# Altium integrated library WCAP-ATLL_rev15a.intlib: 209 symbols (part 1 of 3) (continued)
## WCAP-ATLL 10x12.5x5x0.6 860160375025
designator C?, comment 470 μF
WCAP-ATLL Aluminum Electrolytic Capacitors , 470 μF; + / - 20%; 16 V , 10 x 12,5; Manufacturer: Wurth Elektronik; partNo: 860160375025; E-mail: libraries@we-online.com; Characteristics: Aluminum Electrolytic Capacitor;Recommended soldering: Wave;Operating temperature: –55 °C to +105 °C;Low impedance and high temperature product series;Load life: 3000–10000 h @ +105 °C; ComponentLink1Description: Manufacturer; ComponentLink1URL: http://www.we-online.com; ComponentLink2Description: Datasheet; ComponentLink2URL: http://katalog.we-online.de/pbs/datasheet/860160375025.pdf; Created by: Karrer Zheng; Created Date: 5/13/2015; Capacitance: 470 μF; Application: Used in circuit with rigorous conditions and high ambient temperature;  applied to the secondary side output filtering loop, used in switching power supply with higher operating temperature, DC-DC converter, AC-DC converter, adapter, charger, TV, VCR, DC motor circuit filter, high-end switching power supply, LCD TV, energy saving lamps, electronic ballast, LED lamp and etc.
footprint WCAP-ATLL 10x12.5x5x0.6
pins: 1, 2

## WCAP-ATLL 10x12.5x5x0.6 860160375027
designator C?, comment 560 μF
WCAP-ATLL Aluminum Electrolytic Capacitors , 560 μF; + / - 20%; 16 V , 10 x 12,5; Manufacturer: Wurth Elektronik; partNo: 860160375027; E-mail: libraries@we-online.com; Characteristics: Aluminum Electrolytic Capacitor;Recommended soldering: Wave;Operating temperature: –55 °C to +105 °C;Low impedance and high temperature product series;Load life: 3000–10000 h @ +105 °C; ComponentLink1Description: Manufacturer; ComponentLink1URL: http://www.we-online.com; ComponentLink2Description: Datasheet; ComponentLink2URL: http://katalog.we-online.de/pbs/datasheet/860160375027.pdf; Created by: Karrer Zheng; Created Date: 5/13/2015; Capacitance: 560 μF; Application: Used in circuit with rigorous conditions and high ambient temperature;  applied to the secondary side output filtering loop, used in switching power supply with higher operating temperature, DC-DC converter, AC-DC converter, adapter, charger, TV, VCR, DC motor circuit filter, high-end switching power supply, LCD TV, energy saving lamps, electronic ballast, LED lamp and etc.
footprint WCAP-ATLL 10x12.5x5x0.6
pins: 1, 2

## WCAP-ATLL 10x16x5x0.6 860160375029
designator C?, comment 680 μF
WCAP-ATLL Aluminum Electrolytic Capacitors , 680 μF; + / - 20%; 16 V , 10 x 16; Manufacturer: Wurth Elektronik; partNo: 860160375029; E-mail: libraries@we-online.com; Characteristics: Aluminum Electrolytic Capacitor;Recommended soldering: Wave;Operating temperature: –55 °C to +105 °C;Low impedance and high temperature product series;Load life: 3000–10000 h @ +105 °C; ComponentLink1Description: Manufacturer; ComponentLink1URL: http://www.we-online.com; ComponentLink2Description: Datasheet; ComponentLink2URL: http://katalog.we-online.de/pbs/datasheet/860160375029.pdf; Created by: Karrer Zheng; Created Date: 5/13/2015; Capacitance: 680 μF; Application: Used in circuit with rigorous conditions and high ambient temperature;  applied to the secondary side output filtering loop, used in switching power supply with higher operating temperature, DC-DC converter, AC-DC converter, adapter, charger, TV, VCR, DC motor circuit filter, high-end switching power supply, LCD TV, energy saving lamps, electronic ballast, LED lamp and etc.
footprint WCAP-ATLL 10x16x5x0.6
pins: 1, 2

## WCAP-ATLL 10x16x5x0.6 860160375031
designator C?, comment 820 μF
WCAP-ATLL Aluminum Electrolytic Capacitors , 820 μF; + / - 20%; 16 V , 10 x 16; Manufacturer: Wurth Elektronik; partNo: 860160375031; E-mail: libraries@we-online.com; Characteristics: Aluminum Electrolytic Capacitor;Recommended soldering: Wave;Operating temperature: –55 °C to +105 °C;Low impedance and high temperature product series;Load life: 3000–10000 h @ +105 °C; ComponentLink1Description: Manufacturer; ComponentLink1URL: http://www.we-online.com; ComponentLink2Description: Datasheet; ComponentLink2URL: http://katalog.we-online.de/pbs/datasheet/860160375031.pdf; Created by: Karrer Zheng; Created Date: 5/13/2015; Capacitance: 820 μF; Application: Used in circuit with rigorous conditions and high ambient temperature;  applied to the secondary side output filtering loop, used in switching power supply with higher operating temperature, DC-DC converter, AC-DC converter, adapter, charger, TV, VCR, DC motor circuit filter, high-end switching power supply, LCD TV, energy saving lamps, electronic ballast, LED lamp and etc.
footprint WCAP-ATLL 10x16x5x0.6
pins: 1, 2

## WCAP-ATLL 10x16x5x0.6 860160375032
designator C?, comment 1000 μF
WCAP-ATLL Aluminum Electrolytic Capacitors , 1000 μF; + / - 20%; 16 V , 10 x 16; Manufacturer: Wurth Elektronik; partNo: 860160375032; E-mail: libraries@we-online.com; Characteristics: Aluminum Electrolytic Capacitor;Recommended soldering: Wave;Operating temperature: –55 °C to +105 °C;Low impedance and high temperature product series;Load life: 3000–10000 h @ +105 °C; ComponentLink1Description: Manufacturer; ComponentLink1URL: http://www.we-online.com; ComponentLink2Description: Datasheet; ComponentLink2URL: http://katalog.we-online.de/pbs/datasheet/860160375032.pdf; Created by: Karrer Zheng; Created Date: 5/13/2015; Capacitance: 1000 μF; Application: Used in circuit with rigorous conditions and high ambient temperature;  applied to the secondary side output filtering loop, used in switching power supply with higher operating temperature, DC-DC converter, AC-DC converter, adapter, charger, TV, VCR, DC motor circuit filter, high-end switching power supply, LCD TV, energy saving lamps, electronic ballast, LED lamp and etc.
footprint WCAP-ATLL 10x16x5x0.6
pins: 1, 2

## WCAP-ATLL 10x20x5x0.6 860160375033
designator C?, comment 1200 μF
WCAP-ATLL Aluminum Electrolytic Capacitors , 1200 μF; + / - 20%; 16 V , 10 x 20; Manufacturer: Wurth Elektronik; partNo: 860160375033; E-mail: libraries@we-online.com; Characteristics: Aluminum Electrolytic Capacitor;Recommended soldering: Wave;Operating temperature: –55 °C to +105 °C;Low impedance and high temperature product series;Load life: 3000–10000 h @ +105 °C; ComponentLink1Description: Manufacturer; ComponentLink1URL: http://www.we-online.com; ComponentLink2Description: Datasheet; ComponentLink2URL: http://katalog.we-online.de/pbs/datasheet/860160375033.pdf; Created by: Karrer Zheng; Created Date: 5/13/2015; Capacitance: 1200 μF; Application: Used in circuit with rigorous conditions and high ambient temperature;  applied to the secondary side output filtering loop, used in switching power supply with higher operating temperature, DC-DC converter, AC-DC converter, adapter, charger, TV, VCR, DC motor circuit filter, high-end switching power supply, LCD TV, energy saving lamps, electronic ballast, LED lamp and etc.
footprint WCAP-ATLL 10x20x5x0.6
pins: 1, 2

## WCAP-ATLL 10x25x5x0.6 860160375034
designator C?, comment 1500 μF
WCAP-ATLL Aluminum Electrolytic Capacitors , 1500 μF; + / - 20%; 16 V , 10 x 25; Manufacturer: Wurth Elektronik; partNo: 860160375034; E-mail: libraries@we-online.com; Characteristics: Aluminum Electrolytic Capacitor;Recommended soldering: Wave;Operating temperature: –55 °C to +105 °C;Low impedance and high temperature product series;Load life: 3000–10000 h @ +105 °C; ComponentLink1Description: Manufacturer; ComponentLink1URL: http://www.we-online.com; ComponentLink2Description: Datasheet; ComponentLink2URL: http://katalog.we-online.de/pbs/datasheet/860160375034.pdf; Created by: Karrer Zheng; Created Date: 5/13/2015; Capacitance: 1500 μF; Application: Used in circuit with rigorous conditions and high ambient temperature;  applied to the secondary side output filtering loop, used in switching power supply with higher operating temperature, DC-DC converter, AC-DC converter, adapter, charger, TV, VCR, DC motor circuit filter, high-end switching power supply, LCD TV, energy saving lamps, electronic ballast, LED lamp and etc.
footprint WCAP-ATLL 10x25x5x0.6
pins: 1, 2

## WCAP-ATLL 10x30x5x0.6 860160375036
designator C?, comment 1800 μF
WCAP-ATLL Aluminum Electrolytic Capacitors , 1800 μF; + / - 20%; 16 V , 10 x 30; Manufacturer: Wurth Elektronik; partNo: 860160375036; E-mail: libraries@we-online.com; Characteristics: Aluminum Electrolytic Capacitor;Recommended soldering: Wave;Operating temperature: –55 °C to +105 °C;Low impedance and high temperature product series;Load life: 3000–10000 h @ +105 °C; ComponentLink1Description: Manufacturer; ComponentLink1URL: http://www.we-online.com; ComponentLink2Description: Datasheet; ComponentLink2URL: http://katalog.we-online.de/pbs/datasheet/860160375036.pdf; Created by: Karrer Zheng; Created Date: 5/13/2015; Capacitance: 1800 μF; Application: Used in circuit with rigorous conditions and high ambient temperature;  applied to the secondary side output filtering loop, used in switching power supply with higher operating temperature, DC-DC converter, AC-DC converter, adapter, charger, TV, VCR, DC motor circuit filter, high-end switching power supply, LCD TV, energy saving lamps, electronic ballast, LED lamp and etc.
footprint WCAP-ATLL 10x30x5x0.6
pins: 1, 2

## WCAP-ATLL 13x20x5x0.6 860160378035
designator C?, comment 1500 μF
WCAP-ATLL Aluminum Electrolytic Capacitors , 1500 μF; + / - 20%; 16 V , 13 x 20; Manufacturer: Wurth Elektronik; partNo: 860160378035; E-mail: libraries@we-online.com; Characteristics: Aluminum Electrolytic Capacitor;Recommended soldering: Wave;Operating temperature: –55 °C to +105 °C;Low impedance and high temperature product series;Load life: 3000–10000 h @ +105 °C; ComponentLink1Description: Manufacturer; ComponentLink1URL: http://www.we-online.com; ComponentLink2Description: Datasheet; ComponentLink2URL: http://katalog.we-online.de/pbs/datasheet/860160378035.pdf; Created by: Karrer Zheng; Created Date: 5/13/2015; Capacitance: 1500 μF; Application: Used in circuit with rigorous conditions and high ambient temperature;  applied to the secondary side output filtering loop, used in switching power supply with higher operating temperature, DC-DC converter, AC-DC converter, adapter, charger, TV, VCR, DC motor circuit filter, high-end switching power supply, LCD TV, energy saving lamps, electronic ballast, LED lamp and etc.
footprint WCAP-ATLL 13x20x5x0.6
pins: 1, 2

## WCAP-ATLL 13x20x5x0.6 860160378037
designator C?, comment 1800 μF
WCAP-ATLL Aluminum Electrolytic Capacitors , 1800 μF; + / - 20%; 16 V , 13 x 20; Manufacturer: Wurth Elektronik; partNo: 860160378037; E-mail: libraries@we-online.com; Characteristics: Aluminum Electrolytic Capacitor;Recommended soldering: Wave;Operating temperature: –55 °C to +105 °C;Low impedance and high temperature product series;Load life: 3000–10000 h @ +105 °C; ComponentLink1Description: Manufacturer; ComponentLink1URL: http://www.we-online.com; ComponentLink2Description: Datasheet; ComponentLink2URL: http://katalog.we-online.de/pbs/datasheet/860160378037.pdf; Created by: Karrer Zheng; Created Date: 5/13/2015; Capacitance: 1800 μF; Application: Used in circuit with rigorous conditions and high ambient temperature;  applied to the secondary side output filtering loop, used in switching power supply with higher operating temperature, DC-DC converter, AC-DC converter, adapter, charger, TV, VCR, DC motor circuit filter, high-end switching power supply, LCD TV, energy saving lamps, electronic ballast, LED lamp and etc.
footprint WCAP-ATLL 13x20x5x0.6
pins: 1, 2

## WCAP-ATLL 13x20x5x0.6 860160378038
designator C?, comment 2200 μF
WCAP-ATLL Aluminum Electrolytic Capacitors , 2200 μF; + / - 20%; 16 V , 13 x 20; Manufacturer: Wurth Elektronik; partNo: 860160378038; E-mail: libraries@we-online.com; Characteristics: Aluminum Electrolytic Capacitor;Recommended soldering: Wave;Operating temperature: –55 °C to +105 °C;Low impedance and high temperature product series;Load life: 3000–10000 h @ +105 °C; ComponentLink1Description: Manufacturer; ComponentLink1URL: http://www.we-online.com; ComponentLink2Description: Datasheet; ComponentLink2URL: http://katalog.we-online.de/pbs/datasheet/860160378038.pdf; Created by: Karrer Zheng; Created Date: 5/13/2015; Capacitance: 2200 μF; Application: Used in circuit with rigorous conditions and high ambient temperature;  applied to the secondary side output filtering loop, used in switching power supply with higher operating temperature, DC-DC converter, AC-DC converter, adapter, charger, TV, VCR, DC motor circuit filter, high-end switching power supply, LCD TV, energy saving lamps, electronic ballast, LED lamp and etc.
footprint WCAP-ATLL 13x20x5x0.6
pins: 1, 2

## WCAP-ATLL 13x25x5x0.6 860160378039
designator C?, comment 2700 μF
WCAP-ATLL Aluminum Electrolytic Capacitors , 2700 μF; + / - 20%; 16 V , 13 x 25; Manufacturer: Wurth Elektronik; partNo: 860160378039; E-mail: libraries@we-online.com; Characteristics: Aluminum Electrolytic Capacitor;Recommended soldering: Wave;Operating temperature: –55 °C to +105 °C;Low impedance and high temperature product series;Load life: 3000–10000 h @ +105 °C; ComponentLink1Description: Manufacturer; ComponentLink1URL: http://www.we-online.com; ComponentLink2Description: Datasheet; ComponentLink2URL: http://katalog.we-online.de/pbs/datasheet/860160378039.pdf; Created by: Karrer Zheng; Created Date: 5/13/2015; Capacitance: 2700 μF; Application: Used in circuit with rigorous conditions and high ambient temperature;  applied to the secondary side output filtering loop, used in switching power supply with higher operating temperature, DC-DC converter, AC-DC converter, adapter, charger, TV, VCR, DC motor circuit filter, high-end switching power supply, LCD TV, energy saving lamps, electronic ballast, LED lamp and etc.
footprint WCAP-ATLL 13x25x5x0.6
pins: 1, 2

## WCAP-ATLL 13x30x5x0.6 860160378040
designator C?, comment 3300 μF
WCAP-ATLL Aluminum Electrolytic Capacitors , 3300 μF; + / - 20%; 16 V , 13 x 30; Manufacturer: Wurth Elektronik; partNo: 860160378040; E-mail: libraries@we-online.com; Characteristics: Aluminum Electrolytic Capacitor;Recommended soldering: Wave;Operating temperature: –55 °C to +105 °C;Low impedance and high temperature product series;Load life: 3000–10000 h @ +105 °C; ComponentLink1Description: Manufacturer; ComponentLink1URL: http://www.we-online.com; ComponentLink2Description: Datasheet; ComponentLink2URL: http://katalog.we-online.de/pbs/datasheet/860160378040.pdf; Created by: Karrer Zheng; Created Date: 5/13/2015; Capacitance: 3300 μF; Application: Used in circuit with rigorous conditions and high ambient temperature;  applied to the secondary side output filtering loop, used in switching power supply with higher operating temperature, DC-DC converter, AC-DC converter, adapter, charger, TV, VCR, DC motor circuit filter, high-end switching power supply, LCD TV, energy saving lamps, electronic ballast, LED lamp and etc.
footprint WCAP-ATLL 13x30x5x0.6
pins: 1, 2

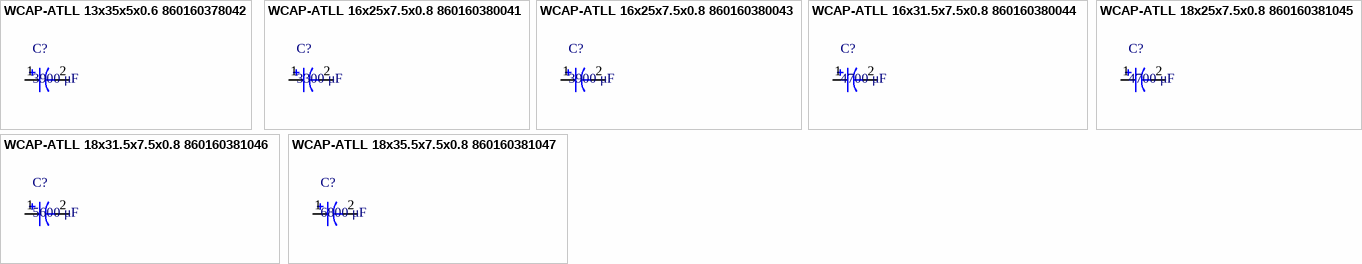
[diagram p3: symbols WCAP-ATLL 13x35x5x0.6 860160378042 to WCAP-ATLL 18x35.5x7.5x0.8 860160381047]

## WCAP-ATLL 13x35x5x0.6 860160378042
designator C?, comment 3900 μF
WCAP-ATLL Aluminum Electrolytic Capacitors , 3900 μF; + / - 20%; 16 V , 13 x 35; Manufacturer: Wurth Elektronik; partNo: 860160378042; E-mail: libraries@we-online.com; Characteristics: Aluminum Electrolytic Capacitor;Recommended soldering: Wave;Operating temperature: –55 °C to +105 °C;Low impedance and high temperature product series;Load life: 3000–10000 h @ +105 °C; ComponentLink1Description: Manufacturer; ComponentLink1URL: http://www.we-online.com; ComponentLink2Description: Datasheet; ComponentLink2URL: http://katalog.we-online.de/pbs/datasheet/860160378042.pdf; Created by: Karrer Zheng; Created Date: 5/13/2015; Capacitance: 3900 μF; Application: Used in circuit with rigorous conditions and high ambient temperature;  applied to the secondary side output filtering loop, used in switching power supply with higher operating temperature, DC-DC converter, AC-DC converter, adapter, charger, TV, VCR, DC motor circuit filter, high-end switching power supply, LCD TV, energy saving lamps, electronic ballast, LED lamp and etc.
footprint WCAP-ATLL 13x35x5x0.6
pins: 1, 2

## WCAP-ATLL 16x25x7.5x0.8 860160380041
designator C?, comment 3300 μF
WCAP-ATLL Aluminum Electrolytic Capacitors , 3300 μF; + / - 20%; 16 V , 16 x 25; Manufacturer: Wurth Elektronik; partNo: 860160380041; E-mail: libraries@we-online.com; Characteristics: Aluminum Electrolytic Capacitor;Recommended soldering: Wave;Operating temperature: –55 °C to +105 °C;Low impedance and high temperature product series;Load life: 3000–10000 h @ +105 °C; ComponentLink1Description: Manufacturer; ComponentLink1URL: http://www.we-online.com; ComponentLink2Description: Datasheet; ComponentLink2URL: http://katalog.we-online.de/pbs/datasheet/860160380041.pdf; Created by: Karrer Zheng; Created Date: 5/13/2015; Capacitance: 3300 μF; Application: Used in circuit with rigorous conditions and high ambient temperature;  applied to the secondary side output filtering loop, used in switching power supply with higher operating temperature, DC-DC converter, AC-DC converter, adapter, charger, TV, VCR, DC motor circuit filter, high-end switching power supply, LCD TV, energy saving lamps, electronic ballast, LED lamp and etc.
footprint WCAP-ATLL 16x25x7.5x0.8
pins: 1, 2

## WCAP-ATLL 16x25x7.5x0.8 860160380043
designator C?, comment 3900 μF
WCAP-ATLL Aluminum Electrolytic Capacitors , 3900 μF; + / - 20%; 16 V , 16 x 25; Manufacturer: Wurth Elektronik; partNo: 860160380043; E-mail: libraries@we-online.com; Characteristics: Aluminum Electrolytic Capacitor;Recommended soldering: Wave;Operating temperature: –55 °C to +105 °C;Low impedance and high temperature product series;Load life: 3000–10000 h @ +105 °C; ComponentLink1Description: Manufacturer; ComponentLink1URL: http://www.we-online.com; ComponentLink2Description: Datasheet; ComponentLink2URL: http://katalog.we-online.de/pbs/datasheet/860160380043.pdf; Created by: Karrer Zheng; Created Date: 5/13/2015; Capacitance: 3900 μF; Application: Used in circuit with rigorous conditions and high ambient temperature;  applied to the secondary side output filtering loop, used in switching power supply with higher operating temperature, DC-DC converter, AC-DC converter, adapter, charger, TV, VCR, DC motor circuit filter, high-end switching power supply, LCD TV, energy saving lamps, electronic ballast, LED lamp and etc.
footprint WCAP-ATLL 16x25x7.5x0.8
pins: 1, 2

## WCAP-ATLL 16x31.5x7.5x0.8 860160380044
designator C?, comment 4700 μF
WCAP-ATLL Aluminum Electrolytic Capacitors , 4700 μF; + / - 20%; 16 V , 16 x 31,5; Manufacturer: Wurth Elektronik; partNo: 860160380044; E-mail: libraries@we-online.com; Characteristics: Aluminum Electrolytic Capacitor;Recommended soldering: Wave;Operating temperature: –55 °C to +105 °C;Low impedance and high temperature product series;Load life: 3000–10000 h @ +105 °C; ComponentLink1Description: Manufacturer; ComponentLink1URL: http://www.we-online.com; ComponentLink2Description: Datasheet; ComponentLink2URL: http://katalog.we-online.de/pbs/datasheet/860160380044.pdf; Created by: Karrer Zheng; Created Date: 5/13/2015; Capacitance: 4700 μF; Application: Used in circuit with rigorous conditions and high ambient temperature;  applied to the secondary side output filtering loop, used in switching power supply with higher operating temperature, DC-DC converter, AC-DC converter, adapter, charger, TV, VCR, DC motor circuit filter, high-end switching power supply, LCD TV, energy saving lamps, electronic ballast, LED lamp and etc.
footprint WCAP-ATLL 16x31.5x7.5x0.8
pins: 1, 2

## WCAP-ATLL 18x25x7.5x0.8 860160381045
designator C?, comment 4700 μF
WCAP-ATLL Aluminum Electrolytic Capacitors , 4700 μF; + / - 20%; 16 V , 18 x 25; Manufacturer: Wurth Elektronik; partNo: 860160381045; E-mail: libraries@we-online.com; Characteristics: Aluminum Electrolytic Capacitor;Recommended soldering: Wave;Operating temperature: –55 °C to +105 °C;Low impedance and high temperature product series;Load life: 3000–10000 h @ +105 °C; ComponentLink1Description: Manufacturer; ComponentLink1URL: http://www.we-online.com; ComponentLink2Description: Datasheet; ComponentLink2URL: http://katalog.we-online.de/pbs/datasheet/860160381045.pdf; Created by: Karrer Zheng; Created Date: 5/13/2015; Capacitance: 4700 μF; Application: Used in circuit with rigorous conditions and high ambient temperature;  applied to the secondary side output filtering loop, used in switching power supply with higher operating temperature, DC-DC converter, AC-DC converter, adapter, charger, TV, VCR, DC motor circuit filter, high-end switching power supply, LCD TV, energy saving lamps, electronic ballast, LED lamp and etc.
footprint WCAP-ATLL 18x25x7.5x0.8
pins: 1, 2

## WCAP-ATLL 18x31.5x7.5x0.8 860160381046
designator C?, comment 5600 μF
WCAP-ATLL Aluminum Electrolytic Capacitors , 5600 μF; + / - 20%; 16 V , 18 x 31,5; Manufacturer: Wurth Elektronik; partNo: 860160381046; E-mail: libraries@we-online.com; Characteristics: Aluminum Electrolytic Capacitor;Recommended soldering: Wave;Operating temperature: –55 °C to +105 °C;Low impedance and high temperature product series;Load life: 3000–10000 h @ +105 °C; ComponentLink1Description: Manufacturer; ComponentLink1URL: http://www.we-online.com; ComponentLink2Description: Datasheet; ComponentLink2URL: http://katalog.we-online.de/pbs/datasheet/860160381046.pdf; Created by: Karrer Zheng; Created Date: 5/13/2015; Capacitance: 5600 μF; Application: Used in circuit with rigorous conditions and high ambient temperature;  applied to the secondary side output filtering loop, used in switching power supply with higher operating temperature, DC-DC converter, AC-DC converter, adapter, charger, TV, VCR, DC motor circuit filter, high-end switching power supply, LCD TV, energy saving lamps, electronic ballast, LED lamp and etc.
footprint WCAP-ATLL 18x31.5x7.5x0.8
pins: 1, 2

## WCAP-ATLL 18x35.5x7.5x0.8 860160381047
designator C?, comment 6800 μF
WCAP-ATLL Aluminum Electrolytic Capacitors , 6800 μF; + / - 20%; 16 V , 18 x 35,5; Manufacturer: Wurth Elektronik; partNo: 860160381047; E-mail: libraries@we-online.com; Characteristics: Aluminum Electrolytic Capacitor;Recommended soldering: Wave;Operating temperature: –55 °C to +105 °C;Low impedance and high temperature product series;Load life: 3000–10000 h @ +105 °C; ComponentLink1Description: Manufacturer; ComponentLink1URL: http://www.we-online.com; ComponentLink2Description: Datasheet; ComponentLink2URL: http://katalog.we-online.de/pbs/datasheet/860160381047.pdf; Created by: Karrer Zheng; Created Date: 5/13/2015; Capacitance: 6800 μF; Application: Used in circuit with rigorous conditions and high ambient temperature;  applied to the secondary side output filtering loop, used in switching power supply with higher operating temperature, DC-DC converter, AC-DC converter, adapter, charger, TV, VCR, DC motor circuit filter, high-end switching power supply, LCD TV, energy saving lamps, electronic ballast, LED lamp and etc.
footprint WCAP-ATLL 18x35.5x7.5x0.8
pins: 1, 2


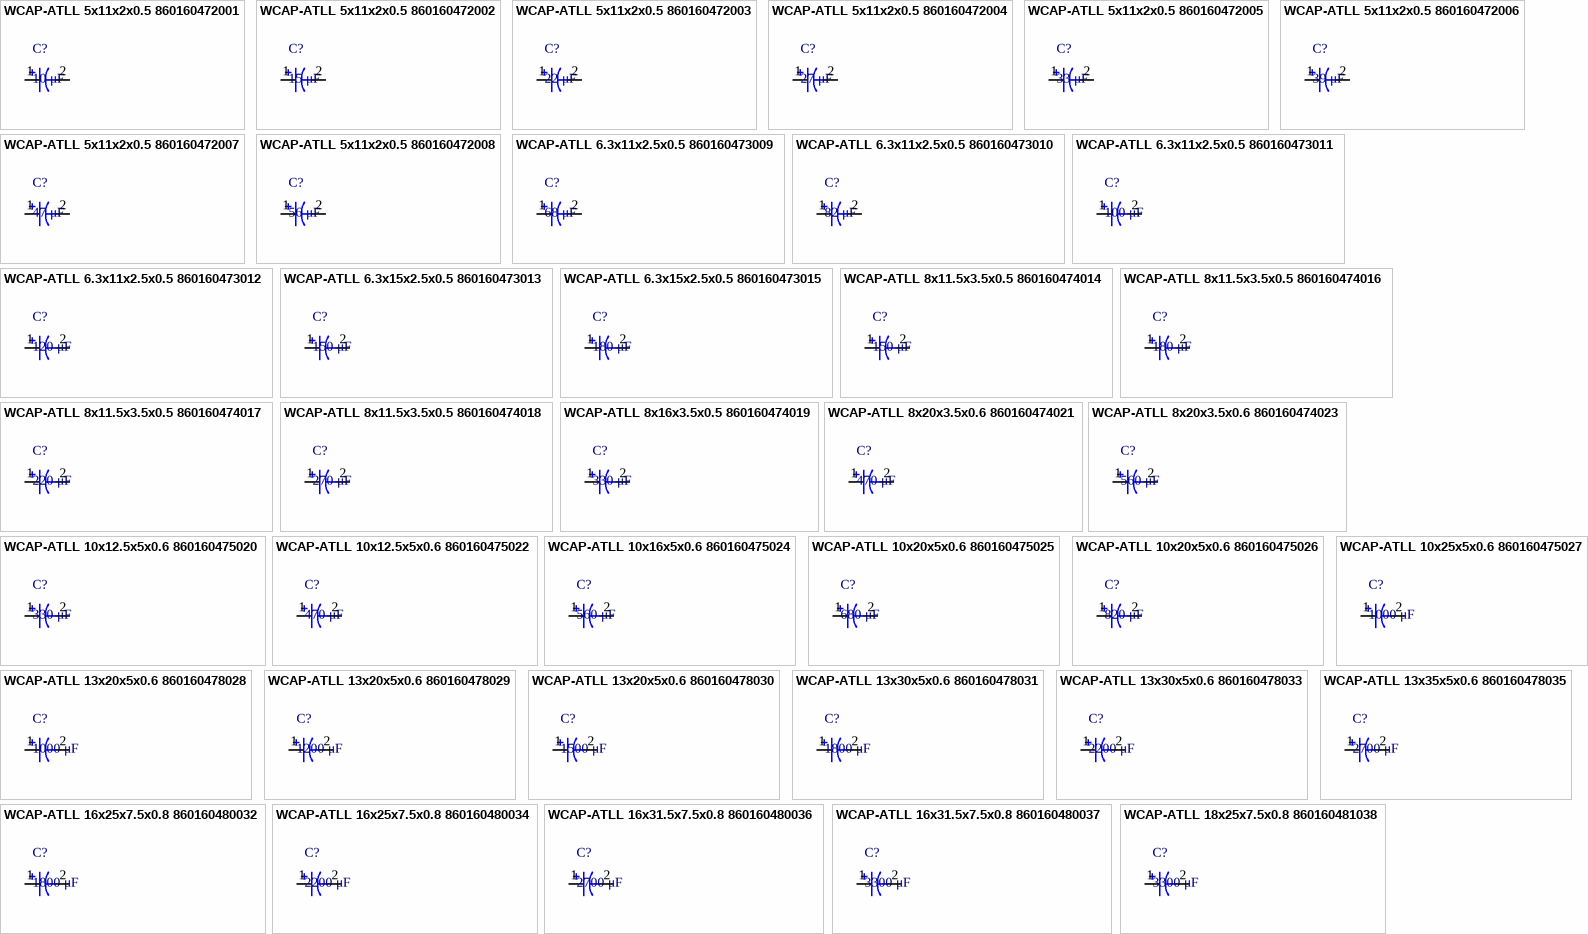
[diagram p4: symbols WCAP-ATLL 5x11x2x0.5 860160472001 to WCAP-ATLL 18x25x7.5x0.8 860160481038]

## WCAP-ATLL 5x11x2x0.5 860160472001
designator C?, comment 10 μF
WCAP-ATLL Aluminum Electrolytic Capacitors , 10 μF; + / - 20%; 25 V , 5 x 11; Manufacturer: Wurth Elektronik; partNo: 860160472001; E-mail: libraries@we-online.com; Characteristics: Aluminum Electrolytic Capacitor;Recommended soldering: Wave;Operating temperature: –55 °C to +105 °C;Low impedance and high temperature product series;Load life: 3000–10000 h @ +105 °C; ComponentLink1Description: Manufacturer; ComponentLink1URL: http://www.we-online.com; ComponentLink2Description: Datasheet; ComponentLink2URL: http://katalog.we-online.de/pbs/datasheet/860160472001.pdf; Created by: Karrer Zheng; Created Date: 5/13/2015; Capacitance: 10 μF; Application: Used in circuit with rigorous conditions and high ambient temperature;  applied to the secondary side output filtering loop, used in switching power supply with higher operating temperature, DC-DC converter, AC-DC converter, adapter, charger, TV, VCR, DC motor circuit filter, high-end switching power supply, LCD TV, energy saving lamps, electronic ballast, LED lamp and etc.
footprint WCAP-ATLL 5x11x2x0.5
pins: 1, 2

## WCAP-ATLL 5x11x2x0.5 860160472002
designator C?, comment 15 μF
WCAP-ATLL Aluminum Electrolytic Capacitors , 15 μF; + / - 20%; 25 V , 5 x 11; Manufacturer: Wurth Elektronik; partNo: 860160472002; E-mail: libraries@we-online.com; Characteristics: Aluminum Electrolytic Capacitor;Recommended soldering: Wave;Operating temperature: –55 °C to +105 °C;Low impedance and high temperature product series;Load life: 3000–10000 h @ +105 °C; ComponentLink1Description: Manufacturer; ComponentLink1URL: http://www.we-online.com; ComponentLink2Description: Datasheet; ComponentLink2URL: http://katalog.we-online.de/pbs/datasheet/860160472002.pdf; Created by: Karrer Zheng; Created Date: 5/13/2015; Capacitance: 15 μF; Application: Used in circuit with rigorous conditions and high ambient temperature;  applied to the secondary side output filtering loop, used in switching power supply with higher operating temperature, DC-DC converter, AC-DC converter, adapter, charger, TV, VCR, DC motor circuit filter, high-end switching power supply, LCD TV, energy saving lamps, electronic ballast, LED lamp and etc.
footprint WCAP-ATLL 5x11x2x0.5
pins: 1, 2

## WCAP-ATLL 5x11x2x0.5 860160472003
designator C?, comment 22 μF
WCAP-ATLL Aluminum Electrolytic Capacitors , 22 μF; + / - 20%; 25 V , 5 x 11; Manufacturer: Wurth Elektronik; partNo: 860160472003; E-mail: libraries@we-online.com; Characteristics: Aluminum Electrolytic Capacitor;Recommended soldering: Wave;Operating temperature: –55 °C to +105 °C;Low impedance and high temperature product series;Load life: 3000–10000 h @ +105 °C; ComponentLink1Description: Manufacturer; ComponentLink1URL: http://www.we-online.com; ComponentLink2Description: Datasheet; ComponentLink2URL: http://katalog.we-online.de/pbs/datasheet/860160472003.pdf; Created by: Karrer Zheng; Created Date: 5/13/2015; Capacitance: 22 μF; Application: Used in circuit with rigorous conditions and high ambient temperature;  applied to the secondary side output filtering loop, used in switching power supply with higher operating temperature, DC-DC converter, AC-DC converter, adapter, charger, TV, VCR, DC motor circuit filter, high-end switching power supply, LCD TV, energy saving lamps, electronic ballast, LED lamp and etc.
footprint WCAP-ATLL 5x11x2x0.5
pins: 1, 2

## WCAP-ATLL 5x11x2x0.5 860160472004
designator C?, comment 27 μF
WCAP-ATLL Aluminum Electrolytic Capacitors , 27 μF; + / - 20%; 25 V , 5 x 11; Manufacturer: Wurth Elektronik; partNo: 860160472004; E-mail: libraries@we-online.com; Characteristics: Aluminum Electrolytic Capacitor;Recommended soldering: Wave;Operating temperature: –55 °C to +105 °C;Low impedance and high temperature product series;Load life: 3000–10000 h @ +105 °C; ComponentLink1Description: Manufacturer; ComponentLink1URL: http://www.we-online.com; ComponentLink2Description: Datasheet; ComponentLink2URL: http://katalog.we-online.de/pbs/datasheet/860160472004.pdf; Created by: Karrer Zheng; Created Date: 5/13/2015; Capacitance: 27 μF; Application: Used in circuit with rigorous conditions and high ambient temperature;  applied to the secondary side output filtering loop, used in switching power supply with higher operating temperature, DC-DC converter, AC-DC converter, adapter, charger, TV, VCR, DC motor circuit filter, high-end switching power supply, LCD TV, energy saving lamps, electronic ballast, LED lamp and etc.
footprint WCAP-ATLL 5x11x2x0.5
pins: 1, 2

## WCAP-ATLL 5x11x2x0.5 860160472005
designator C?, comment 33 μF
WCAP-ATLL Aluminum Electrolytic Capacitors , 33 μF; + / - 20%; 25 V , 5 x 11; Manufacturer: Wurth Elektronik; partNo: 860160472005; E-mail: libraries@we-online.com; Characteristics: Aluminum Electrolytic Capacitor;Recommended soldering: Wave;Operating temperature: –55 °C to +105 °C;Low impedance and high temperature product series;Load life: 3000–10000 h @ +105 °C; ComponentLink1Description: Manufacturer; ComponentLink1URL: http://www.we-online.com; ComponentLink2Description: Datasheet; ComponentLink2URL: http://katalog.we-online.de/pbs/datasheet/860160472005.pdf; Created by: Karrer Zheng; Created Date: 5/13/2015; Capacitance: 33 μF; Application: Used in circuit with rigorous conditions and high ambient temperature;  applied to the secondary side output filtering loop, used in switching power supply with higher operating temperature, DC-DC converter, AC-DC converter, adapter, charger, TV, VCR, DC motor circuit filter, high-end switching power supply, LCD TV, energy saving lamps, electronic ballast, LED lamp and etc.
footprint WCAP-ATLL 5x11x2x0.5
pins: 1, 2

## WCAP-ATLL 5x11x2x0.5 860160472006
designator C?, comment 39 μF
WCAP-ATLL Aluminum Electrolytic Capacitors , 39 μF; + / - 20%; 25 V , 5 x 11; Manufacturer: Wurth Elektronik; partNo: 860160472006; E-mail: libraries@we-online.com; Characteristics: Aluminum Electrolytic Capacitor;Recommended soldering: Wave;Operating temperature: –55 °C to +105 °C;Low impedance and high temperature product series;Load life: 3000–10000 h @ +105 °C; ComponentLink1Description: Manufacturer; ComponentLink1URL: http://www.we-online.com; ComponentLink2Description: Datasheet; ComponentLink2URL: http://katalog.we-online.de/pbs/datasheet/860160472006.pdf; Created by: Karrer Zheng; Created Date: 5/13/2015; Capacitance: 39 μF; Application: Used in circuit with rigorous conditions and high ambient temperature;  applied to the secondary side output filtering loop, used in switching power supply with higher operating temperature, DC-DC converter, AC-DC converter, adapter, charger, TV, VCR, DC motor circuit filter, high-end switching power supply, LCD TV, energy saving lamps, electronic ballast, LED lamp and etc.
footprint WCAP-ATLL 5x11x2x0.5
pins: 1, 2

## WCAP-ATLL 5x11x2x0.5 860160472007
designator C?, comment 47 μF
WCAP-ATLL Aluminum Electrolytic Capacitors , 47 μF; + / - 20%; 25 V , 5 x 11; Manufacturer: Wurth Elektronik; partNo: 860160472007; E-mail: libraries@we-online.com; Characteristics: Aluminum Electrolytic Capacitor;Recommended soldering: Wave;Operating temperature: –55 °C to +105 °C;Low impedance and high temperature product series;Load life: 3000–10000 h @ +105 °C; ComponentLink1Description: Manufacturer; ComponentLink1URL: http://www.we-online.com; ComponentLink2Description: Datasheet; ComponentLink2URL: http://katalog.we-online.de/pbs/datasheet/860160472007.pdf; Created by: Karrer Zheng; Created Date: 5/13/2015; Capacitance: 47 μF; Application: Used in circuit with rigorous conditions and high ambient temperature;  applied to the secondary side output filtering loop, used in switching power supply with higher operating temperature, DC-DC converter, AC-DC converter, adapter, charger, TV, VCR, DC motor circuit filter, high-end switching power supply, LCD TV, energy saving lamps, electronic ballast, LED lamp and etc.
footprint WCAP-ATLL 5x11x2x0.5
pins: 1, 2